# Altium footprint library TYCO THD.PcbLib: 146 footprints (part 11 of 11)
Each footprint in its own frame and in the unit in brackets; x right, y up, seen from the top. Pads: shape width x height; smd on the part's side, far side on the other; paste and mask are expansions set on the pad; w line width, h text height; cw(c..) or ccw(c..) is an arc to the next point about the centre after c.
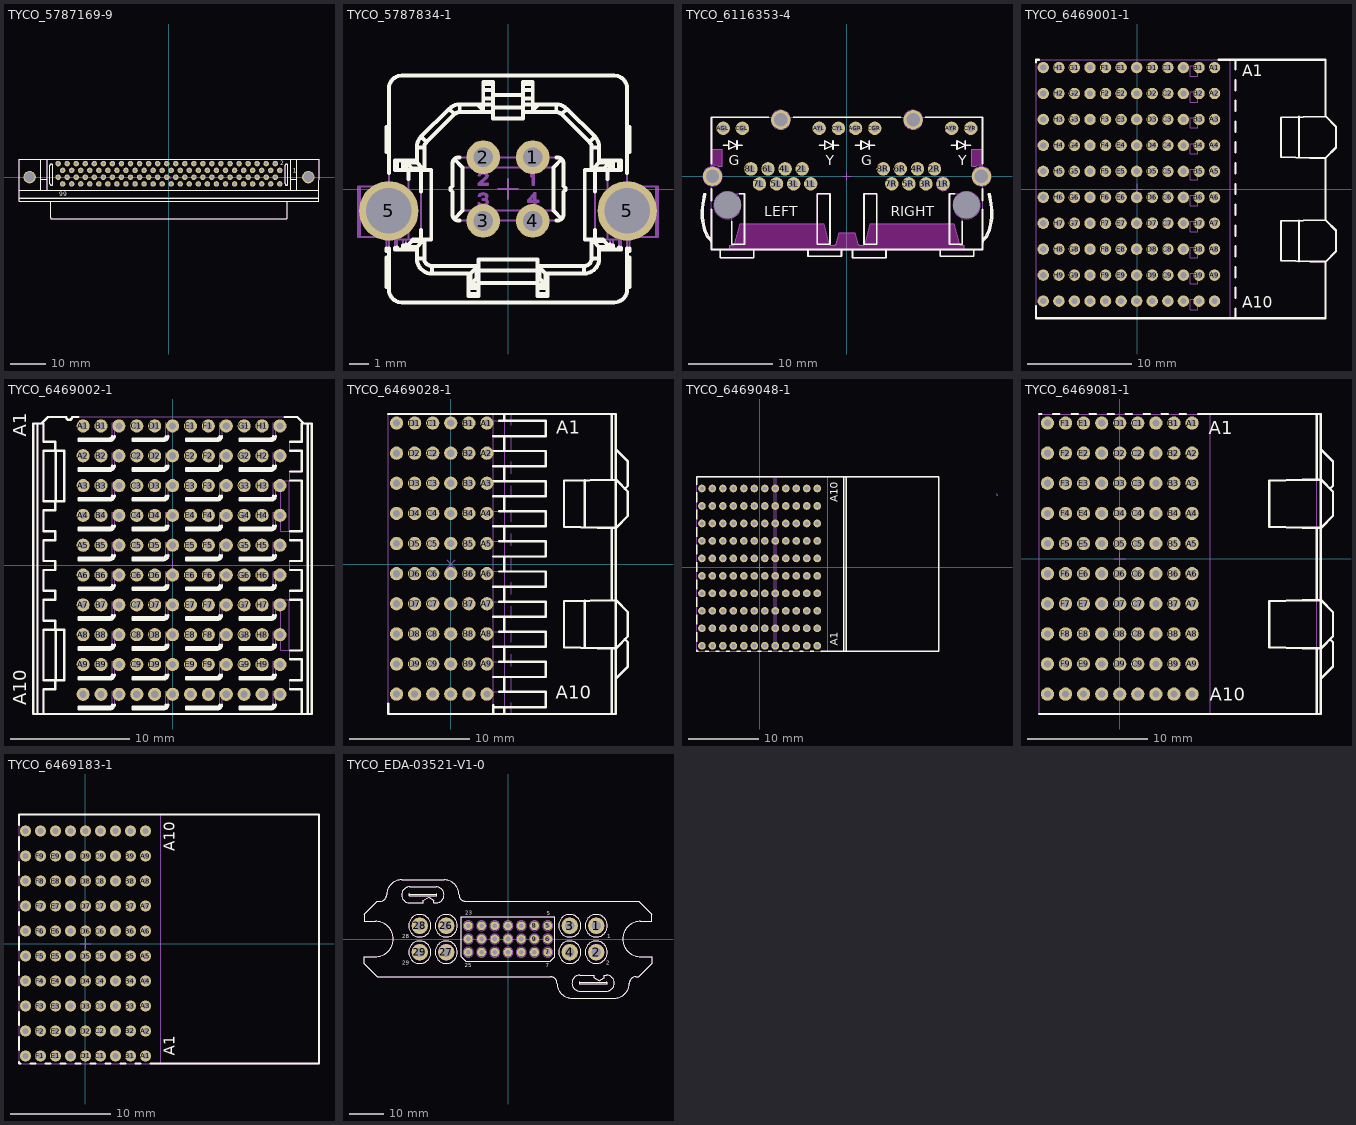
[diagram p10: the footprints below, top view; thin cyan lines are the x and y axes]

## TYCO_5787169-9 [mm] "100 Positions, .050 Right Angle D-Sub Receptacle, Series III"
height 9.5
pads (102):
  round 1.55 hole 0.85: 1(31.115,1.905) 2(29.845,3.81) 3(28.575,1.905) 4(27.305,3.81) 5(26.035,1.905) 6(24.765,3.81) 7(23.495,1.905) 8(22.225,3.81) 9(20.955,1.905) 10(19.685,3.81) 11(18.415,1.905) 12(17.145,3.81) 13(15.875,1.905) 14(14.605,3.81) 15(13.335,1.905) 16(12.065,3.81) 17(10.795,1.905) 18(9.525,3.81) 19(8.255,1.905) 20(6.985,3.81) 21(5.715,1.905) 22(4.445,3.81) 23(3.175,1.905) 24(1.905,3.81) 25(0.635,1.905) 26(-0.635,3.81) 27(-1.905,1.905) 28(-3.175,3.81) 29(-4.445,1.905) 30(-5.715,3.81) 31(-6.985,1.905) 32(-8.255,3.81) 33(-9.525,1.905) 34(-10.795,3.81) 35(-12.065,1.905) 36(-13.335,3.81) 37(-14.605,1.905) 38(-15.875,3.81) 39(-17.145,1.905) 40(-18.415,3.81) 41(-19.685,1.905) 42(-20.955,3.81) 43(-22.225,1.905) 44(-23.495,3.81) 45(-24.765,1.905) 46(-26.035,3.81) 47(-27.305,1.905) 48(-28.575,3.81) 49(-29.845,1.905) 50(-31.115,3.81) 51(31.115,-1.905) 52(29.845,0) 53(28.575,-1.905) 54(27.305,0) 55(26.035,-1.905) 56(24.765,0) 57(23.495,-1.905) 58(22.225,0) 59(20.955,-1.905) 60(19.685,0) 61(18.415,-1.905) 62(17.145,0) 63(15.875,-1.905) 64(14.605,0) 65(13.335,-1.905) 66(12.065,0) 67(10.795,-1.905) 68(9.525,0) 69(8.255,-1.905) 70(6.985,0) 71(5.715,-1.905) 72(4.445,0) 73(3.175,-1.905) 74(1.905,0) 75(0.635,-1.905) 76(-0.635,0) 77(-1.905,-1.905) 78(-3.175,0) 79(-4.445,-1.905) 80(-5.715,0) 81(-6.985,-1.905) 82(-8.255,0) 83(-9.525,-1.905) 84(-10.795,0) 85(-12.065,-1.905) 86(-13.335,0) 87(-14.605,-1.905) 88(-15.875,0) 89(-17.145,-1.905) 90(-18.415,0) 91(-19.685,-1.905) 92(-20.955,0) 93(-22.225,-1.905) 94(-23.495,0) 95(-24.765,-1.905) 96(-26.035,0) 97(-27.305,-1.905) 98(-28.575,0) 99(-29.845,-1.905) 100(-31.115,0)
  round 3.5 hole 2.8: 101(39.116,0) 102(-39.116,0)
Top Overlay:
  lines w0.1: -33.401,-1.864 ccw(c-33.02,-1.864) -32.639,-1.864 ; -33.401,3.317 cw(c-33.02,3.317) -32.639,3.317 ; -33.223,-11.394 ccw(c-32.923,-11.394) -32.923,-11.694 ; 32.639,-1.864 ccw(c33.02,-1.864) 33.401,-1.864 ; 32.639,3.317 cw(c33.02,3.317) 33.401,3.317 ; 32.923,-11.694 ccw(c32.923,-11.394) 33.223,-11.394
  lines w0.2: -42.1,-5.903 42.102,-5.932 ; -42.1,-3.693 42.101,-3.693 ; -35.941,-3.693 -35.941,5.07 ; -35.941,-0.518 -34.163,-0.518 ; -34.163,-3.693 -34.163,5.07 ; -33.401,-1.864 -33.401,3.317 ; -33.223,-11.394 -33.223,-6.69 ; -32.923,-11.694 32.923,-11.694 ; -32.639,-1.864 -32.639,3.317 ; 32.639,-1.864 32.639,3.317 ; 33.223,-11.394 33.223,-6.69 ; 33.401,-1.864 33.401,3.317 ; 34.163,-3.693 34.163,5.07 ; 34.163,-0.518 35.941,-0.518 ; 35.941,-3.693 35.941,5.07 ; 42.101,5.07 -42.1,5.07 -42.1,-6.69 42.101,-6.69 42.128,5.07
  text "99" at -30.75,-5.35 h1.2
  text "1" at 34.775,1.25 h1.2
  text "2" at 31.205,3.37 h1.2
Mechanical 8:
  drawing of 414 lines, arcs and shapes, not listed
  text "PCB Edge" at -4.325,-5.25 h1.2
Mechanical 14:
  circle w0.1: c-39.116,-0.01 r1.092
  circle w0.1: c39.116,-0.01 r1.092
  lines w0.1: -42.1,-5.903 42.102,-5.932 ; -42.1,-3.693 42.101,-3.693 ; -35.941,-3.693 -35.941,5.07 ; -35.941,-0.518 -34.163,-0.518 ; -34.163,-3.693 -34.163,5.07 ; -33.223,-6.69 -33.223,-11.394 ccw(c-32.923,-11.394) -32.923,-11.694 32.923,-11.694 ccw(c32.923,-11.394) 33.223,-11.394 33.223,-6.69 ; 34.163,-3.693 34.163,5.07 ; 34.163,-0.518 35.941,-0.518 ; 35.941,-3.693 35.941,5.07 ; 42.101,5.07 -42.1,5.07 -42.1,-6.69 42.101,-6.69 42.128,5.07 ; -33.401,-1.864 ccw(c-33.02,-1.864) -32.639,-1.864 -32.639,3.317 ccw(c-33.02,3.317) -33.401,3.317 -33.401,-1.864 ; 32.639,-1.864 ccw(c33.02,-1.864) 33.401,-1.864 33.401,3.317 ccw(c33.02,3.317) 32.639,3.317 32.639,-1.864
  text "99" at -30.75,-5.35 h1.2
  text "51" at 32.25,-2.55 h1.2
  text "52" at 31.769,-0.573 h1.2
  text "2" at 31.205,3.37 h1.2
  text "1" at 34.775,1.25 h1.2
3D body "TYCO_5787169-9.stp": height 9.5, standoff -2.54, extent -42.1,-11.694 42.101,5.07

## TYCO_5787834-1 [mm] "4 Position, Straight USB Type B Receptacle"
height 15.62
pads (6):
  round 1.7 hole 1: 1(1.25,1.605) 2(-1.25,1.605) 3(-1.25,-1.605) 4(1.25,-1.605)
  round 3 hole 2.3: 5(-6.02,-1.1) 5(6.02,-1.1)
Top Overlay:
  drawing of 188 lines, arcs and shapes, not listed
Mechanical 8:
  lines w0.1: -6.52,-1.1 -6.02,-1.1 ; -6.02,-1.6 -6.02,-1.1 ; -6.02,-0.6 -6.02,-1.1 ; -5.52,-1.1 -6.02,-1.1 ; -1.75,-1.605 -1.25,-1.605 ; -1.75,1.605 -1.25,1.605 ; -1.25,-2.105 -1.25,-1.605 ; -1.25,-1.105 -1.25,-1.605 ; -1.25,1.105 -1.25,1.605 ; -1.25,2.105 -1.25,1.605 ; -0.75,-1.605 -1.25,-1.605 ; -0.75,1.605 -1.25,1.605 ; -0.5,0 0,0 ; 0,-0.5 0,0 ; 0,0.5 0,0 ; 0.5,0 0,0 ; 0.75,-1.605 1.25,-1.605 ; 0.75,1.605 1.25,1.605 ; 1.25,-2.105 1.25,-1.605 ; 1.25,-1.105 1.25,-1.605 ; 1.25,1.105 1.25,1.605 ; 1.25,2.105 1.25,1.605 ; 1.75,-1.605 1.25,-1.605 ; 1.75,1.605 1.25,1.605 ; 5.52,-1.1 6.02,-1.1 ; 6.02,-1.6 6.02,-1.1 ; 6.02,-0.6 6.02,-1.1 ; 6.52,-1.1 6.02,-1.1
Mechanical 14:
  drawing of 314 lines, arcs and shapes, not listed
3D body "TYCO_5787834-1.stp": height 15.62, standoff -4.02, extent -7.571,-5.723 7.572,5.733

## TYCO_6116353-4 [mm] "2 Port, Yellow/Green LEDs, Right Angle RJ45 10/100 Base-T Ethernet Jack Module (Inverted Face)"
height 13.97
pads (30):
  round 1.6 hole 0.9: 1L(-4.318,-0.889) 1R(11.43,-0.889) 2L(-5.334,0.889) 2R(10.414,0.889) 3L(-6.35,-0.889) 3R(9.398,-0.889) 4L(-7.366,0.889) 4R(8.382,0.889) 5L(-8.382,-0.889) 5R(7.366,-0.889) 6L(-9.398,0.889) 6R(6.35,0.889) 7L(-10.414,-0.889) 7R(5.334,-0.889) 8L(-11.43,0.889) 8R(4.318,0.889) AGL(-14.732,5.715) AGR(1.016,5.715) AYL(-3.302,5.715) AYR(12.446,5.715) CGL(-12.446,5.715) CGR(3.302,5.715) CYL(-1.016,5.715) CYR(14.732,5.715)
  round 0.5 hole 3.2 unplated mask+1.35: M1(14.224,-3.429) M2(-14.224,-3.429)
  round 2.3 hole 1.6: SHIELD(-16.002,0) SHIELD(-7.874,6.731) SHIELD(7.874,6.731) SHIELD(16.002,0)
Top Layer keep-out:
  region: -13.97,-8.204 -13.589,-8.204 -13.548,-8.201 -13.469,-8.174 -13.404,-8.124 -13.358,-8.055 -13.344,-8.016 -12.714,-5.664 -2.794,-5.664 -2.164,-8.016 -2.15,-8.055 -2.104,-8.124 -2.038,-8.174 -1.96,-8.201 -1.919,-8.204 -1.524,-8.204 -1.483,-8.201 -1.404,-8.174 -1.339,-8.124 -1.293,-8.055 -1.279,-8.016 -0.921,-6.68 0.921,-6.68 1.279,-8.016 1.293,-8.055 1.339,-8.124 1.404,-8.174 1.483,-8.201 1.524,-8.204 1.919,-8.204 1.96,-8.201 2.038,-8.174 2.104,-8.124 2.15,-8.055 2.164,-8.016 2.794,-5.664 12.714,-5.664 13.344,-8.016 13.358,-8.055 13.404,-8.124 13.469,-8.174 13.548,-8.201 13.589,-8.204 13.97,-8.204 13.97,-8.712 -13.97,-8.712
  region: -16.129,1.344 -16.031,1.35 -15.836,1.34 -15.644,1.302 -15.46,1.236 -15.372,1.194 -14.859,1.194 -14.859,3.226 -16.129,3.226
  region: 14.859,1.194 15.372,1.194 15.46,1.236 15.644,1.302 15.836,1.34 16.031,1.35 16.129,1.344 16.129,3.226 14.859,3.226
Top Overlay:
  lines w0.2: -16.129,-8.077 ccw(c-16.891,-8.077) -16.401,-7.493 cw(c-15.459,-6.371) -16.81,-6.939 cw(c-10.845,-4.407) -17.23,-3.299 -17.018,-2.057 -16.824,-2.09 -17.036,-3.332 ccw(c-10.817,-4.404) -16.653,-6.805 ccw(c-15.459,-6.371) -16.275,-7.344 cw(c-16.891,-8.077) -16.129,-7.497 ; -16.129,-3.95 -16.129,-8.712 16.129,-8.712 16.129,-3.95 ; -16.129,-2.908 -16.129,-1.495 ; -16.129,1.495 -16.129,7.036 -9.343,7.036 ; -15.088,-8.712 -15.088,-9.685 -11.1,-9.685 -11.1,-8.712 ; -14.732,3.715 -14.089,3.715 ; -13.716,-5.338 -13.716,-8.077 -12.192,-8.077 -12.192,-2.057 -12.803,-2.057 ; -13.089,3.215 -13.089,4.215 ; -12.446,3.715 -13.089,3.715 ; -6.405,7.036 6.405,7.036 ; -4.648,-8.712 -4.648,-9.522 -0.66,-9.522 -0.66,-8.712 ; -3.302,3.715 -2.659,3.715 ; -1.659,3.215 -1.659,4.215 ; -1.016,3.715 -1.659,3.715 ; 0.66,-8.712 0.66,-9.685 4.648,-9.685 4.648,-8.712 ; 1.016,3.715 1.659,3.715 ; 2.659,3.215 2.659,4.215 ; 3.302,3.715 2.659,3.715 ; 9.343,7.036 16.129,7.036 16.129,1.495 ; 11.1,-8.712 11.1,-9.522 15.088,-9.522 15.088,-8.712 ; 12.446,3.715 13.089,3.715 ; 12.803,-2.057 12.192,-2.057 12.192,-8.077 13.716,-8.077 13.716,-5.338 ; 14.089,3.215 14.089,4.215 ; 14.732,3.715 14.089,3.715 ; 16.129,-2.908 16.129,-1.495 ; 16.13,-8.077 cw(c16.892,-8.077) 16.402,-7.493 ccw(c15.46,-6.371) 16.811,-6.939 ccw(c10.846,-4.407) 17.231,-3.299 17.019,-2.057 16.825,-2.09 17.037,-3.332 cw(c10.818,-4.403) 16.654,-6.805 cw(c15.46,-6.371) 16.277,-7.343 ccw(c16.892,-8.077) 16.13,-7.497 ; -13.089,3.715 -14.089,4.215 -14.089,3.215 -13.089,3.715 ; -1.659,3.715 -2.659,4.215 -2.659,3.215 -1.659,3.715 ; 2.659,3.715 1.659,4.215 1.659,3.215 2.659,3.715 ; 14.089,3.715 13.089,4.215 13.089,3.215 14.089,3.715 ; -3.556,-8.077 -2.032,-8.077 -2.032,-2.057 -3.556,-2.057 -3.556,-8.077 ; 2.032,-8.077 3.556,-8.077 3.556,-2.057 2.032,-2.057 2.032,-8.077
  text "RIGHT" at 5.218,-4.75 h1.2
  text "LEFT" at -9.83,-4.75 h1.2
  text "Y" at 13.218,1.35 h1.2
  text "Y" at -2.53,1.35 h1.2
  text "G" at 1.697,1.35 h1.2
  text "G" at -14.051,1.35 h1.2
Mechanical 8:
  drawing of 191 lines, arcs and shapes, not listed
  text "1" at 11.82,-2.115 h1.2
  text "8" at 4.828,3.365 h1.2
Mechanical 14:
  lines w0.1: -16.129,-8.077 ccw(c-16.891,-8.077) -16.401,-7.493 cw(c-15.459,-6.371) -16.81,-6.939 cw(c-10.845,-4.407) -17.23,-3.299 -17.018,-2.057 -16.824,-2.09 -17.036,-3.332 ccw(c-10.817,-4.404) -16.653,-6.805 ccw(c-15.459,-6.371) -16.275,-7.344 cw(c-16.891,-8.077) -16.129,-7.497 ; -15.088,-8.712 -15.088,-9.685 -11.1,-9.685 -11.1,-8.712 ; -14.732,3.715 -14.089,3.715 ; -13.089,3.215 -13.089,4.215 ; -12.446,3.715 -13.089,3.715 ; -4.648,-8.712 -4.648,-9.522 -0.66,-9.522 -0.66,-8.712 ; -3.302,3.715 -2.659,3.715 ; -1.659,3.215 -1.659,4.215 ; -1.016,3.715 -1.659,3.715 ; 0.66,-8.712 0.66,-9.685 4.648,-9.685 4.648,-8.712 ; 1.016,3.715 1.659,3.715 ; 2.659,3.215 2.659,4.215 ; 3.302,3.715 2.659,3.715 ; 11.1,-8.712 11.1,-9.522 15.088,-9.522 15.088,-8.712 ; 12.446,3.715 13.089,3.715 ; 14.089,3.215 14.089,4.215 ; 14.732,3.715 14.089,3.715 ; 16.13,-8.077 cw(c16.892,-8.077) 16.402,-7.493 ccw(c15.46,-6.371) 16.811,-6.939 ccw(c10.846,-4.407) 17.231,-3.299 17.019,-2.057 16.825,-2.09 17.037,-3.332 cw(c10.818,-4.403) 16.654,-6.805 cw(c15.46,-6.371) 16.277,-7.343 ccw(c16.892,-8.077) 16.13,-7.497 ; -13.089,3.715 -14.089,4.215 -14.089,3.215 -13.089,3.715 ; -1.659,3.715 -2.659,4.215 -2.659,3.215 -1.659,3.715 ; 2.659,3.715 1.659,4.215 1.659,3.215 2.659,3.715 ; 14.089,3.715 13.089,4.215 13.089,3.215 14.089,3.715 ; -16.129,-8.712 -16.129,7.036 16.129,7.036 16.129,-8.712 -16.129,-8.712 ; -13.716,-8.077 -12.192,-8.077 -12.192,-2.057 -13.716,-2.057 -13.716,-8.077 ; -3.556,-8.077 -2.032,-8.077 -2.032,-2.057 -3.556,-2.057 -3.556,-8.077 ; 2.032,-8.077 3.556,-8.077 3.556,-2.057 2.032,-2.057 2.032,-8.077 ; 12.192,-8.077 13.716,-8.077 13.716,-2.057 12.192,-2.057 12.192,-8.077
  text "RIGHT" at 5.218,-4.75 h1.2
  text "LEFT" at -9.83,-4.75 h1.2
  text "Y" at 13.218,1.35 h1.2
  text "Y" at -2.53,1.35 h1.2
  text "G" at 1.697,1.35 h1.2
  text "G" at -14.051,1.35 h1.2
3D body "TYCO_6116353-4.stp": height 14.56, standoff -4.17, extent -17.324,-9.685 17.325,7.036

## TYCO_6469001-1 [mm] "80 Positions, Pitch 2.5mm,  Advanced TCA, Z-PACK HM-Zd Right Angle Press Fit Receptacle"
height 15.72
pads (120):
  round 1.1 hole 0.6: A1(7.435,11.7) A2(7.435,9.2) A3(7.435,6.7) A4(7.435,4.2) A5(7.435,1.7) A6(7.435,-0.8) A7(7.435,-3.3) A8(7.435,-5.8) A9(7.435,-8.3) A10(7.435,-10.8) B1(5.935,11.7) B2(5.935,9.2) B3(5.935,6.7) B4(5.935,4.2) B5(5.935,1.7) B6(5.935,-0.8) B7(5.935,-3.3) B8(5.935,-5.8) B9(5.935,-8.3) B10(5.935,-10.8) BG1(4.435,11.7) BG2(4.435,9.2) BG3(4.435,6.7) BG4(4.435,4.2) BG5(4.435,1.7) BG6(4.435,-0.8) BG7(4.435,-3.3) BG8(4.435,-5.8) BG9(4.435,-8.3) BG10(4.435,-10.8) C1(2.935,11.7) C2(2.935,9.2) C3(2.935,6.7) C4(2.935,4.2) C5(2.935,1.7) C6(2.935,-0.8) C7(2.935,-3.3) C8(2.935,-5.8) C9(2.935,-8.3) C10(2.935,-10.8) D1(1.435,11.7) D2(1.435,9.2) D3(1.435,6.7) D4(1.435,4.2) D5(1.435,1.7) D6(1.435,-0.8) D7(1.435,-3.3) D8(1.435,-5.8) D9(1.435,-8.3) D10(1.435,-10.8) DG1(-0.065,11.7) DG2(-0.065,9.2) DG3(-0.065,6.7) DG4(-0.065,4.2) DG5(-0.065,1.7) DG6(-0.065,-0.8) DG7(-0.065,-3.3) DG8(-0.065,-5.8) DG9(-0.065,-8.3) DG10(-0.065,-10.8) E1(-1.565,11.7) E2(-1.565,9.2) E3(-1.565,6.7) E4(-1.565,4.2) E5(-1.565,1.7) E6(-1.565,-0.8) E7(-1.565,-3.3) E8(-1.565,-5.8) E9(-1.565,-8.3) E10(-1.565,-10.8) F1(-3.065,11.7) F2(-3.065,9.2) F3(-3.065,6.7) F4(-3.065,4.2) F5(-3.065,1.7) F6(-3.065,-0.8) F7(-3.065,-3.3) F8(-3.065,-5.8) F9(-3.065,-8.3) F10(-3.065,-10.8) FG1(-4.565,11.7) FG2(-4.565,9.2) FG3(-4.565,6.7) FG4(-4.565,4.2) FG5(-4.565,1.7) FG6(-4.565,-0.8) FG7(-4.565,-3.3) FG8(-4.565,-5.8) FG9(-4.565,-8.3) FG10(-4.565,-10.8) G1(-6.065,11.7) G2(-6.065,9.2) G3(-6.065,6.7) G4(-6.065,4.2) G5(-6.065,1.7) G6(-6.065,-0.8) G7(-6.065,-3.3) G8(-6.065,-5.8) G9(-6.065,-8.3) G10(-6.065,-10.8) H1(-7.565,11.7) H2(-7.565,9.2) H3(-7.565,6.7) H4(-7.565,4.2) H5(-7.565,1.7) H6(-7.565,-0.8) H7(-7.565,-3.3) H8(-7.565,-5.8) H9(-7.565,-8.3) H10(-7.565,-10.8) HG1(-9.065,11.7) HG2(-9.065,9.2) HG3(-9.065,6.7) HG4(-9.065,4.2) HG5(-9.065,1.7) HG6(-9.065,-0.8) HG7(-9.065,-3.3) HG8(-9.065,-5.8) HG9(-9.065,-8.3) HG10(-9.065,-10.8)
Top Overlay:
  lines w0.2: -9.765,-11.282 -9.765,-12.45 18.135,-12.45 18.135,-7 ; -9.765,12.182 -9.765,12.45 -9.465,12.45 ; 7.835,12.45 18.135,12.45 18.135,7 ; 9.435,-12.45 9.435,-11.5 ; 9.435,-10.5 9.435,-9.5 ; 9.435,-8.5 9.435,-7.5 ; 9.435,-6.5 9.435,-5.5 ; 9.435,-4.5 9.435,-3.5 ; 9.435,-2.5 9.435,-1.5 ; 9.435,-0.5 9.435,0.5 ; 9.435,1.5 9.435,2.5 ; 9.435,3.5 9.435,4.5 ; 9.435,5.5 9.435,6.5 ; 9.435,7.5 9.435,8.5 ; 9.435,9.5 9.435,10.5 ; 9.435,11.5 9.435,12.45 ; 15.565,-6.963 15.565,-3.037 ; 15.565,3.037 15.565,6.963 ; 18.135,-7 16.635,-7 13.835,-6.903 13.835,-3.097 18.135,-3 ; 18.135,-7 19.135,-6 19.135,-4 18.135,-3 ; 18.135,-3 18.135,3 ; 18.135,3 16.635,3 13.835,3.097 13.835,6.903 18.135,7 ; 18.135,3 19.135,4 19.135,6 18.135,7
  text "A10" at 10.1,-11.425 h1.1
  text "A1" at 10.1,10.85 h1.1
Mechanical 8:
  drawing of 486 lines, arcs and shapes, not listed
  text "PCB Edge" at 10.3,-3.5 h1
Mechanical 14:
  lines w0.1: 9.435,-12.45 9.435,-11.5 ; 9.435,-10.5 9.435,-9.5 ; 9.435,-8.5 9.435,-7.5 ; 9.435,-6.5 9.435,-5.5 ; 9.435,-4.5 9.435,-3.5 ; 9.435,-2.5 9.435,-1.5 ; 9.435,-0.5 9.435,0.5 ; 9.435,1.5 9.435,2.5 ; 9.435,3.5 9.435,4.5 ; 9.435,5.5 9.435,6.5 ; 9.435,7.5 9.435,8.5 ; 9.435,9.5 9.435,10.5 ; 9.435,11.5 9.435,12.45 ; 15.565,-6.963 15.565,-3.037 ; 15.565,3.037 15.565,6.963 ; 18.135,-7 16.635,-7 13.835,-6.903 13.835,-3.097 18.135,-3 ; 18.135,-7 19.135,-6 19.135,-4 18.135,-3 ; 18.135,-7 18.135,-12.45 -9.765,-12.45 -9.765,12.45 18.135,12.45 18.135,7 ; 18.135,-3 18.135,3 ; 18.135,3 16.635,3 13.835,3.097 13.835,6.903 18.135,7 ; 18.135,3 19.135,4 19.135,6 18.135,7 ; 5.115,-11.62 5.115,-10.62 5.835,-10.62 5.835,-11.62 5.115,-11.62 ; 5.115,-9.12 5.115,-8.12 5.835,-8.12 5.835,-9.12 5.115,-9.12 ; 5.115,-6.62 5.115,-5.62 5.835,-5.62 5.835,-6.62 5.115,-6.62 ; 5.115,-4.12 5.115,-3.12 5.835,-3.12 5.835,-4.12 5.115,-4.12 ; 5.115,-1.62 5.115,-0.62 5.835,-0.62 5.835,-1.62 5.115,-1.62 ; 5.115,0.88 5.115,1.88 5.835,1.88 5.835,0.88 5.115,0.88 ; 5.115,3.38 5.115,4.38 5.835,4.38 5.835,3.38 5.115,3.38 ; 5.115,5.88 5.115,6.88 5.835,6.88 5.835,5.88 5.115,5.88 ; 5.115,8.38 5.115,9.38 5.835,9.38 5.835,8.38 5.115,8.38 ; 5.115,10.88 5.115,11.88 5.835,11.88 5.835,10.88 5.115,10.88
  text "A10" at 10.1,-11.425 h1.1
  text "A1" at 10.1,10.85 h1.1
Drill Drawing:
  lines w0.1: -9.75,-11.55 8.25,-11.55 8.25,12.45 -9.75,12.45 -9.75,-11.55
  text "diam. 0.6mm +0.06 -0" at 11.2,-9.3 h1
  text "PRESS-FIT TECHNOLOGY" at 9.7,-8.3 h1
3D body "TYCO_6469001-1.stp": height 16.67, standoff -4.68, extent -9.765,-12.45 19.135,12.45

## TYCO_6469002-1 [mm] "80 Positions, Pitch 2.5mm,  Advanced TCA, Z-PACK HM-Zd BackPlane Press Fit Header"
height 13.48
pads (120):
  round 1.1 hole 0.6: A1(-7.5,11.7) A2(-7.5,9.2) A3(-7.5,6.7) A4(-7.5,4.2) A5(-7.5,1.7) A6(-7.5,-0.8) A7(-7.5,-3.3) A8(-7.5,-5.8) A9(-7.5,-8.3) A10(-7.5,-10.8) B1(-6,11.7) B2(-6,9.2) B3(-6,6.7) B4(-6,4.2) B5(-6,1.7) B6(-6,-0.8) B7(-6,-3.3) B8(-6,-5.8) B9(-6,-8.3) B10(-6,-10.8) BG1(-4.5,11.7) BG2(-4.5,9.2) BG3(-4.5,6.7) BG4(-4.5,4.2) BG5(-4.5,1.7) BG6(-4.5,-0.8) BG7(-4.5,-3.3) BG8(-4.5,-5.8) BG9(-4.5,-8.3) BG10(-4.5,-10.8) C1(-3,11.7) C2(-3,9.2) C3(-3,6.7) C4(-3,4.2) C5(-3,1.7) C6(-3,-0.8) C7(-3,-3.3) C8(-3,-5.8) C9(-3,-8.3) C10(-3,-10.8) D1(-1.5,11.7) D2(-1.5,9.2) D3(-1.5,6.7) D4(-1.5,4.2) D5(-1.5,1.7) D6(-1.5,-0.8) D7(-1.5,-3.3) D8(-1.5,-5.8) D9(-1.5,-8.3) D10(-1.5,-10.8) DG1(0,11.7) DG2(0,9.2) DG3(0,6.7) DG4(0,4.2) DG5(0,1.7) DG6(0,-0.8) DG7(0,-3.3) DG8(0,-5.8) DG9(0,-8.3) DG10(0,-10.8) E1(1.5,11.7) E2(1.5,9.2) E3(1.5,6.7) E4(1.5,4.2) E5(1.5,1.7) E6(1.5,-0.8) E7(1.5,-3.3) E8(1.5,-5.8) E9(1.5,-8.3) E10(1.5,-10.8) F1(3,11.7) F2(3,9.2) F3(3,6.7) F4(3,4.2) F5(3,1.7) F6(3,-0.8) F7(3,-3.3) F8(3,-5.8) F9(3,-8.3) F10(3,-10.8) FG1(4.5,11.7) FG2(4.5,9.2) FG3(4.5,6.7) FG4(4.5,4.2) FG5(4.5,1.7) FG6(4.5,-0.8) FG7(4.5,-3.3) FG8(4.5,-5.8) FG9(4.5,-8.3) FG10(4.5,-10.8) G1(6,11.7) G2(6,9.2) G3(6,6.7) G4(6,4.2) G5(6,1.7) G6(6,-0.8) G7(6,-3.3) G8(6,-5.8) G9(6,-8.3) G10(6,-10.8) H1(7.5,11.7) H2(7.5,9.2) H3(7.5,6.7) H4(7.5,4.2) H5(7.5,1.7) H6(7.5,-0.8) H7(7.5,-3.3) H8(7.5,-5.8) H9(7.5,-8.3) H10(7.5,-10.8) HG1(9,11.7) HG2(9,9.2) HG3(9,6.7) HG4(9,4.2) HG5(9,1.7) HG6(9,-0.8) HG7(9,-3.3) HG8(9,-5.8) HG9(9,-8.3) HG10(9,-10.8)
Top Overlay:
  drawing of 268 lines, arcs and shapes, not listed
  text "A10" at -12.275,-11.725 h1.1
  text "A1" at -12.275,10.775 h1.1
Mechanical 8:
  drawing of 484 lines, arcs and shapes, not listed
Mechanical 14:
  drawing of 717 lines, arcs and shapes, not listed
  text "A10" at -12.275,-11.725 h1.1
  text "A1" at -12.275,10.775 h1.1
Drill Drawing:
  lines w0.1: -8.25,-11.55 9.75,-11.55 9.75,12.45 -8.25,12.45 -8.25,-11.55
  text "diam. 0.6mm +0.06 -0" at 11.1,-9.2 h1
  text "PRESS-FIT TECHNOLOGY" at -8.8,-8.1 h1
3D body "TYCO_6469002-1.stp": height 13.4, standoff -2.5, extent -11.675,-12.45 11.675,12.45

## TYCO_6469028-1 [mm] "40 Positions, Pitch 2.5mm,  Advanced TCA, Z-PACK HM-Zd Right Angle Press Fit Receptacle"
height 8.58
pads (60):
  round 1.1 hole 0.6: A1(3,11.7) A2(3,9.2) A3(3,6.7) A4(3,4.2) A5(3,1.7) A6(3,-0.8) A7(3,-3.3) A8(3,-5.8) A9(3,-8.3) A10(3,-10.8) B1(1.5,11.7) B2(1.5,9.2) B3(1.5,6.7) B4(1.5,4.2) B5(1.5,1.7) B6(1.5,-0.8) B7(1.5,-3.3) B8(1.5,-5.8) B9(1.5,-8.3) B10(1.5,-10.8) BG1(0,11.7) BG2(0,9.2) BG3(0,6.7) BG4(0,4.2) BG5(0,1.7) BG6(0,-0.8) BG7(0,-3.3) BG8(0,-5.8) BG9(0,-8.3) BG10(0,-10.8) C1(-1.5,11.7) C2(-1.5,9.2) C3(-1.5,6.7) C4(-1.5,4.2) C5(-1.5,1.7) C6(-1.5,-0.8) C7(-1.5,-3.3) C8(-1.5,-5.8) C9(-1.5,-8.3) C10(-1.5,-10.8) D1(-3,11.7) D2(-3,9.2) D3(-3,6.7) D4(-3,4.2) D5(-3,1.7) D6(-3,-0.8) D7(-3,-3.3) D8(-3,-5.8) D9(-3,-8.3) D10(-3,-10.8) DG1(-4.5,11.7) DG2(-4.5,9.2) DG3(-4.5,6.7) DG4(-4.5,4.2) DG5(-4.5,1.7) DG6(-4.5,-0.8) DG7(-4.5,-3.3) DG8(-4.5,-5.8) DG9(-4.5,-8.3) DG10(-4.5,-10.8)
Top Overlay:
  lines w0.2: -5.2,-11.583 -5.2,-12.45 13.7,-12.45 13.7,12.45 -5.2,12.45 ; 3.54,-12.45 3.54,-11.701 ; 3.54,-11.88 7.9,-11.88 7.9,-10.62 4.034,-10.62 ; 3.54,-9.38 7.9,-9.38 7.9,-8.12 4.034,-8.12 ; 3.54,-6.88 7.9,-6.88 7.9,-5.62 4.034,-5.62 ; 3.54,-4.38 7.9,-4.38 7.9,-3.12 4.034,-3.12 ; 3.54,-1.88 7.9,-1.88 7.9,-0.62 4.034,-0.62 ; 3.54,0.62 7.9,0.62 7.9,1.88 4.034,1.88 ; 3.54,3.12 7.9,3.12 7.9,4.38 4.034,4.38 ; 3.54,5.62 7.9,5.62 7.9,6.88 3.54,6.88 ; 3.54,8.12 7.9,8.12 7.9,9.38 3.54,9.38 ; 3.54,10.62 7.9,10.62 7.9,11.88 4.034,11.88 ; 4.45,-12.45 4.45,-11.88 ; 4.45,-10.62 4.45,-9.38 ; 4.45,-8.12 4.45,-6.88 ; 4.45,-5.62 4.45,-4.38 ; 4.45,-3.12 4.45,-1.88 ; 4.45,-0.62 4.45,0.62 ; 4.45,1.88 4.45,3.12 ; 4.45,4.38 4.45,5.62 ; 4.45,6.88 4.45,8.12 ; 4.45,9.38 4.45,10.62 ; 4.45,11.88 4.45,12.45 ; 11.13,-6.963 11.13,-3.037 ; 11.13,3.037 11.13,6.963 ; 13.35,-12.45 13.35,-7 ; 13.35,-3 13.35,3 ; 13.35,7 13.35,12.45 ; 13.7,-9.5 14.7,-8.5 14.7,-6.5 14.45,-6.25 ; 13.7,9.5 14.7,8.5 14.7,6.5 14.45,6.25 ; 9.4,-6.903 12.2,-7 13.7,-7 14.7,-6 14.7,-4 13.7,-3 9.4,-3.097 9.4,-6.903 ; 9.4,3.097 12.2,3 13.7,3 14.7,4 14.7,6 13.7,7 9.4,6.903 9.4,3.097
  text "A10" at 8.7,-11.2 h1.1
  text "A1" at 8.75,10.8 h1.1
Mechanical 8:
  drawing of 246 lines, arcs and shapes, not listed
  text "PCB Edge" at 5.865,-3.5 h1
Mechanical 14:
  lines w0.1: 3.54,-12.45 3.54,12.45 ; 3.54,-11.88 7.9,-11.88 7.9,-10.62 3.54,-10.62 ; 3.54,-9.38 7.9,-9.38 7.9,-8.12 3.54,-8.12 ; 3.54,-6.88 7.9,-6.88 7.9,-5.62 3.54,-5.62 ; 3.54,-4.38 7.9,-4.38 7.9,-3.12 3.54,-3.12 ; 3.54,-1.88 7.9,-1.88 7.9,-0.62 3.54,-0.62 ; 3.54,0.62 7.9,0.62 7.9,1.88 3.54,1.88 ; 3.54,3.12 7.9,3.12 7.9,4.38 3.54,4.38 ; 3.54,5.62 7.9,5.62 7.9,6.88 3.54,6.88 ; 3.54,8.12 7.9,8.12 7.9,9.38 3.54,9.38 ; 3.54,10.62 7.9,10.62 7.9,11.88 3.54,11.88 ; 4.45,-12.45 4.45,-11.88 ; 4.45,-10.62 4.45,-9.38 ; 4.45,-8.12 4.45,-6.88 ; 4.45,-5.62 4.45,-4.38 ; 4.45,-3.12 4.45,-1.88 ; 4.45,-0.62 4.45,0.62 ; 4.45,1.88 4.45,3.12 ; 4.45,4.38 4.45,5.62 ; 4.45,6.88 4.45,8.12 ; 4.45,9.38 4.45,10.62 ; 4.45,11.88 4.45,12.45 ; 5,-12.45 5,-11.5 ; 5,-10.5 5,-9.5 ; 5,-8.5 5,-7.5 ; 5,-6.5 5,-5.5 ; 5,-4.5 5,-3.5 ; 5,-2.5 5,-1.5 ; 5,-0.5 5,0.5 ; 5,1.5 5,2.5 ; 5,3.5 5,4.5 ; 5,5.5 5,6.5 ; 5,7.5 5,8.5 ; 5,9.5 5,10.5 ; 5,11.5 5,12.45 ; 11.13,-6.963 11.13,-3.037 ; 11.13,3.037 11.13,6.963 ; 13.35,-12.45 13.35,-7 ; 13.35,-3 13.35,3 ; 13.35,7 13.35,12.45 ; 13.7,-9.5 14.7,-8.5 14.7,-6.5 14.45,-6.25 ; 13.7,9.5 14.7,8.5 14.7,6.5 14.45,6.25 ; -5.2,-12.45 -5.2,12.45 13.7,12.45 13.7,-12.45 -5.2,-12.45 ; 9.4,-6.903 12.2,-7 13.7,-7 14.7,-6 14.7,-4 13.7,-3 9.4,-3.097 9.4,-6.903 ; 9.4,3.097 12.2,3 13.7,3 14.7,4 14.7,6 13.7,7 9.4,6.903 9.4,3.097
  text "A10" at 8.7,-11.2 h1.1
  text "A1" at 8.75,10.8 h1.1
Drill Drawing:
  lines w0.1: -5.2,-12.45 3.775,-12.45 3.775,12.45 -5.2,12.45 -5.2,-12.45
  text "diam. 0.6mm +0.06 -0" at 6.765,-9.3 h1
  text "PRESS-FIT TECHNOLOGY" at 5.265,-8.3 h1
3D body "TYCO_6469028-1.stp": height 8.67, standoff -4.68, extent -5.2,-12.45 14.7,12.45

## TYCO_6469048-1 [mm] "80 Positions, Pitch 2.5mm,  Advanced TCA, Z-PACK HM-Zd BackPlane Press Fit Header"
height 17.68
pads (120):
  round 1.1 hole 0.6: A1(8.25,-11.25) A2(8.25,-8.75) A3(8.25,-6.25) A4(8.25,-3.75) A5(8.25,-1.25) A6(8.25,1.25) A7(8.25,3.75) A8(8.25,6.25) A9(8.25,8.75) A10(8.25,11.25) B1(6.75,-11.25) B2(6.75,-8.75) B3(6.75,-6.25) B4(6.75,-3.75) B5(6.75,-1.25) B6(6.75,1.25) B7(6.75,3.75) B8(6.75,6.25) B9(6.75,8.75) B10(6.75,11.25) BG1(5.25,-11.25) BG2(5.25,-8.75) BG3(5.25,-6.25) BG4(5.25,-3.75) BG5(5.25,-1.25) BG6(5.25,1.25) BG7(5.25,3.75) BG8(5.25,6.25) BG9(5.25,8.75) BG10(5.25,11.25) C1(3.75,-11.25) C2(3.75,-8.75) C3(3.75,-6.25) C4(3.75,-3.75) C5(3.75,-1.25) C6(3.75,1.25) C7(3.75,3.75) C8(3.75,6.25) C9(3.75,8.75) C10(3.75,11.25) D1(2.25,-11.25) D2(2.25,-8.75) D3(2.25,-6.25) D4(2.25,-3.75) D5(2.25,-1.25) D6(2.25,1.25) D7(2.25,3.75) D8(2.25,6.25) D9(2.25,8.75) D10(2.25,11.25) DG1(0.75,-11.25) DG2(0.75,-8.75) DG3(0.75,-6.25) DG4(0.75,-3.75) DG5(0.75,-1.25) DG6(0.75,1.25) DG7(0.75,3.75) DG8(0.75,6.25) DG9(0.75,8.75) DG10(0.75,11.25) E1(-0.75,-11.25) E2(-0.75,-8.75) E3(-0.75,-6.25) E4(-0.75,-3.75) E5(-0.75,-1.25) E6(-0.75,1.25) E7(-0.75,3.75) E8(-0.75,6.25) E9(-0.75,8.75) E10(-0.75,11.25) F1(-2.25,-11.25) F2(-2.25,-8.75) F3(-2.25,-6.25) F4(-2.25,-3.75) F5(-2.25,-1.25) F6(-2.25,1.25) F7(-2.25,3.75) F8(-2.25,6.25) F9(-2.25,8.75) F10(-2.25,11.25) FG1(-3.75,-11.25) FG2(-3.75,-8.75) FG3(-3.75,-6.25) FG4(-3.75,-3.75) FG5(-3.75,-1.25) FG6(-3.75,1.25) FG7(-3.75,3.75) FG8(-3.75,6.25) FG9(-3.75,8.75) FG10(-3.75,11.25) G1(-5.25,-11.25) G2(-5.25,-8.75) G3(-5.25,-6.25) G4(-5.25,-3.75) G5(-5.25,-1.25) G6(-5.25,1.25) G7(-5.25,3.75) G8(-5.25,6.25) G9(-5.25,8.75) G10(-5.25,11.25) H1(-6.75,-11.25) H2(-6.75,-8.75) H3(-6.75,-6.25) H4(-6.75,-3.75) H5(-6.75,-1.25) H6(-6.75,1.25) H7(-6.75,3.75) H8(-6.75,6.25) H9(-6.75,8.75) H10(-6.75,11.25) HG1(-8.25,-11.25) HG2(-8.25,-8.75) HG3(-8.25,-6.25) HG4(-8.25,-3.75) HG5(-8.25,-1.25) HG6(-8.25,1.25) HG7(-8.25,3.75) HG8(-8.25,6.25) HG9(-8.25,8.75) HG10(-8.25,11.25)
Top Overlay:
  lines w0.2: -8.95,-11.816 -8.95,-12 -8.747,-12 ; -8.95,-10.684 -8.95,-9.316 ; -8.95,-8.184 -8.95,-6.816 ; -8.95,-5.684 -8.95,-4.316 ; -8.95,-3.184 -8.95,-1.816 ; -8.95,-0.684 -8.95,0.684 ; -8.95,1.816 -8.95,3.184 ; -8.95,4.316 -8.95,5.684 ; -8.95,6.816 -8.95,8.184 ; -8.95,9.316 -8.95,10.684 ; -8.95,11.816 -8.95,12.9 25.6,12.9 25.6,-12 8.748,-12 ; -7.752,-12 -7.247,-12 ; -6.252,-12 -5.747,-12 ; -4.752,-12 -4.247,-12 ; -3.252,-12 -2.747,-12 ; -1.752,-12 -1.247,-12 ; -0.252,-12 0.253,-12 ; 1.248,-12 1.753,-12 ; 2.748,-12 3.253,-12 ; 4.248,-12 4.753,-12 ; 5.748,-12 6.253,-12 ; 7.248,-12 7.753,-12 ; 12.025,-12 12.025,12.9 ; 12.38,-12 12.38,12.9
  text "A10" at 11.2,9.25 h1.1
  text "A1" at 11.2,-11.25 h1.1
Mechanical 8:
  drawing of 487 lines, arcs and shapes, not listed
  text "PCB Edge" at 11.115,-3.05 h1
Mechanical 14:
  lines w0.1: 2.08,-12 2.08,12.9 ; 2.38,-12 2.38,12.9 ; 12.025,-12 12.025,12.9 ; 12.38,-12 12.38,12.9 ; -8.95,-12 25.6,-12 25.6,12.9 -8.95,12.9 -8.95,-12
  text "A10" at 11.2,9.25 h1.1
  text "A1" at 11.2,-11.25 h1.1
Drill Drawing:
  lines w0.1: -8.95,-12 -8.95,12.9 9.5,12.9 9.5,-12 -8.95,-12
  text "PRESS-FIT TECHNOLOGY" at -9.5,-7.65 h1
  text "diam. 0.6mm +0.06 -0" at 11,-7.65 h1
3D body "TYCO_6469048-1.stp": height 17.67, standoff -5.68, extent -8.95,-12 25.6,12.9

## TYCO_6469081-1 [mm] "60 Positions, Pitch 2.5mm,  Advanced TCA, Z-PACK HM-Zd BackPlane Press Fit Receptacle"
height 12.18
pads (90):
  round 1.1 hole 0.6: A1(6,11.25) A2(6,8.75) A3(6,6.25) A4(6,3.75) A5(6,1.25) A6(6,-1.25) A7(6,-3.75) A8(6,-6.25) A9(6,-8.75) A10(6,-11.25) B1(4.5,11.25) B2(4.5,8.75) B3(4.5,6.25) B4(4.5,3.75) B5(4.5,1.25) B6(4.5,-1.25) B7(4.5,-3.75) B8(4.5,-6.25) B9(4.5,-8.75) B10(4.5,-11.25) BG1(3,11.25) BG2(3,8.75) BG3(3,6.25) BG4(3,3.75) BG5(3,1.25) BG6(3,-1.25) BG7(3,-3.75) BG8(3,-6.25) BG9(3,-8.75) BG10(3,-11.25) C1(1.5,11.25) C2(1.5,8.75) C3(1.5,6.25) C4(1.5,3.75) C5(1.5,1.25) C6(1.5,-1.25) C7(1.5,-3.75) C8(1.5,-6.25) C9(1.5,-8.75) C10(1.5,-11.25) D1(0,11.25) D2(0,8.75) D3(0,6.25) D4(0,3.75) D5(0,1.25) D6(0,-1.25) D7(0,-3.75) D8(0,-6.25) D9(0,-8.75) D10(0,-11.25) DG1(-1.5,11.25) DG2(-1.5,8.75) DG3(-1.5,6.25) DG4(-1.5,3.75) DG5(-1.5,1.25) DG6(-1.5,-1.25) DG7(-1.5,-3.75) DG8(-1.5,-6.25) DG9(-1.5,-8.75) DG10(-1.5,-11.25) E1(-3,11.25) E2(-3,8.75) E3(-3,6.25) E4(-3,3.75) E5(-3,1.25) E6(-3,-1.25) E7(-3,-3.75) E8(-3,-6.25) E9(-3,-8.75) E10(-3,-11.25) F1(-4.5,11.25) F2(-4.5,8.75) F3(-4.5,6.25) F4(-4.5,3.75) F5(-4.5,1.25) F6(-4.5,-1.25) F7(-4.5,-3.75) F8(-4.5,-6.25) F9(-4.5,-8.75) F10(-4.5,-11.25) FG1(-6,11.25) FG2(-6,8.75) FG3(-6,6.25) FG4(-6,3.75) FG5(-6,1.25) FG6(-6,-1.25) FG7(-6,-3.75) FG8(-6,-6.25) FG9(-6,-8.75) FG10(-6,-11.25)
Top Overlay:
  lines w0.2: -6.7,-12.9 16.7,-12.9 16.7,12 6.498,12 ; -6.7,12 -6.497,12 ; -5.502,12 -4.997,12 ; -4.002,12 -3.497,12 ; -2.502,12 -1.997,12 ; -1.002,12 -0.497,12 ; 0.498,12 1.003,12 ; 1.998,12 2.503,12 ; 3.498,12 4.003,12 ; 4.998,12 5.503,12 ; 16.35,-12.9 16.35,-7.45 ; 16.35,-3.45 16.35,2.55 ; 16.35,6.55 16.35,12 ; 16.7,-9.95 17.7,-8.95 17.7,-6.95 17.45,-6.7 ; 16.7,9.05 17.7,8.05 17.7,6.05 17.45,5.8 ; 12.4,-7.352 12.4,-3.548 15.2,-3.45 16.7,-3.45 17.7,-4.45 17.7,-6.45 16.7,-7.45 15.2,-7.45 12.4,-7.352 ; 12.4,2.648 12.4,6.452 15.2,6.55 16.7,6.55 17.7,5.55 17.7,3.55 16.7,2.55 15.2,2.55 12.4,2.648
  text "A10" at 7.475,-11.8 h1.1
  text "A1" at 7.375,10.325 h1.1
Mechanical 8:
  drawing of 366 lines, arcs and shapes, not listed
  text "PCB Edge" at 8.865,-3.95 h1
Mechanical 14:
  lines w0.1: 16.35,-12.9 16.35,12 ; 16.7,-9.95 17.7,-8.95 17.7,-6.95 17.45,-6.7 ; 16.7,9.05 17.7,8.05 17.7,6.05 17.45,5.8 ; -6.7,-12.9 -6.7,12 16.7,12 16.7,-12.9 -6.7,-12.9 ; 12.4,-7.352 12.4,-3.548 15.2,-3.45 16.7,-3.45 17.7,-4.45 17.7,-6.45 16.7,-7.45 15.2,-7.45 12.4,-7.352 ; 12.4,2.648 12.4,6.452 15.2,6.55 16.7,6.55 17.7,5.55 17.7,3.55 16.7,2.55 15.2,2.55 12.4,2.648
  text "A10" at 7.475,-11.8 h1.1
  text "A1" at 7.375,10.325 h1.1
Drill Drawing:
  lines w0.1: -6.7,-12.9 -6.7,12 7.5,12 7.5,-12.9 -6.7,-12.9
  text "PRESS-FIT TECHNOLOGY" at -7.25,-8.55 h1
  text "diam. 0.6mm +0.06 -0" at 9,-9 h1
3D body "TYCO_6469081-1.stp": height 12.17, standoff -4.68, extent -6.7,-12.9 17.7,12

## TYCO_6469183-1 [mm] "60 Positions, Pitch 2.5mm,  Advanced TCA, Z-PACK HM-Zd BackPlane Press Fit Header"
height 13.31
pads (90):
  round 1.1 hole 0.6: A1(6,-11.25) A2(6,-8.75) A3(6,-6.25) A4(6,-3.75) A5(6,-1.25) A6(6,1.25) A7(6,3.75) A8(6,6.25) A9(6,8.75) A10(6,11.25) B1(4.5,-11.25) B2(4.5,-8.75) B3(4.5,-6.25) B4(4.5,-3.75) B5(4.5,-1.25) B6(4.5,1.25) B7(4.5,3.75) B8(4.5,6.25) B9(4.5,8.75) B10(4.5,11.25) BG1(3,-11.25) BG2(3,-8.75) BG3(3,-6.25) BG4(3,-3.75) BG5(3,-1.25) BG6(3,1.25) BG7(3,3.75) BG8(3,6.25) BG9(3,8.75) BG10(3,11.25) C1(1.5,-11.25) C2(1.5,-8.75) C3(1.5,-6.25) C4(1.5,-3.75) C5(1.5,-1.25) C6(1.5,1.25) C7(1.5,3.75) C8(1.5,6.25) C9(1.5,8.75) C10(1.5,11.25) D1(0,-11.25) D2(0,-8.75) D3(0,-6.25) D4(0,-3.75) D5(0,-1.25) D6(0,1.25) D7(0,3.75) D8(0,6.25) D9(0,8.75) D10(0,11.25) DG1(-1.5,-11.25) DG2(-1.5,-8.75) DG3(-1.5,-6.25) DG4(-1.5,-3.75) DG5(-1.5,-1.25) DG6(-1.5,1.25) DG7(-1.5,3.75) DG8(-1.5,6.25) DG9(-1.5,8.75) DG10(-1.5,11.25) E1(-3,-11.25) E2(-3,-8.75) E3(-3,-6.25) E4(-3,-3.75) E5(-3,-1.25) E6(-3,1.25) E7(-3,3.75) E8(-3,6.25) E9(-3,8.75) E10(-3,11.25) F1(-4.5,-11.25) F2(-4.5,-8.75) F3(-4.5,-6.25) F4(-4.5,-3.75) F5(-4.5,-1.25) F6(-4.5,1.25) F7(-4.5,3.75) F8(-4.5,6.25) F9(-4.5,8.75) F10(-4.5,11.25) FG1(-6,-11.25) FG2(-6,-8.75) FG3(-6,-6.25) FG4(-6,-3.75) FG5(-6,-1.25) FG6(-6,1.25) FG7(-6,3.75) FG8(-6,6.25) FG9(-6,8.75) FG10(-6,11.25)
Top Overlay:
  lines w0.2: -6.65,-11.873 -6.65,-12 -6.497,-12 ; -6.65,-10.628 -6.65,-9.373 ; -6.65,-8.128 -6.65,-6.872 ; -6.65,-5.628 -6.65,-4.372 ; -6.65,-3.128 -6.65,-1.872 ; -6.65,-0.628 -6.65,0.628 ; -6.65,1.872 -6.65,3.128 ; -6.65,4.372 -6.65,5.628 ; -6.65,6.872 -6.65,8.128 ; -6.65,9.373 -6.65,10.628 ; -6.65,11.873 -6.65,12.9 23.35,12.9 23.35,-12 6.498,-12 ; -5.502,-12 -4.997,-12 ; -4.002,-12 -3.497,-12 ; -2.502,-12 -1.997,-12 ; -1.002,-12 -0.497,-12 ; 0.498,-12 1.003,-12 ; 1.998,-12 2.503,-12 ; 3.498,-12 4.003,-12 ; 4.998,-12 5.503,-12
  text "A1" at 8.95,-11.25 h1.1
  text "A10" at 8.95,9.25 h1.1
Mechanical 8:
  drawing of 366 lines, arcs and shapes, not listed
  text "PCB Edge" at 8.865,-3.05 h1
Mechanical 14:
  lines w0.1: -6.65,-12 23.35,-12 23.35,12.9 -6.65,12.9 -6.65,-12
  text "A1" at 8.95,-11.25 h1.1
  text "A10" at 8.95,9.25 h1.1
Drill Drawing:
  lines w0.1: -6.65,-12 -6.65,12.9 7.55,12.9 7.55,-12 -6.65,-12
  text "PRESS-FIT TECHNOLOGY" at -7.2,-7.65 h1
  text "diam. 0.6mm +0.06 -0" at 9.05,-8.1 h1
3D body "TYCO_6469183-1.stp": height 13.31, standoff -5.68, extent -6.65,-12 23.35,12.9

## TYCO_EDA-03521-V1-0 [mm] "TYCO ELECTRONICS 1648206-1 Adapter Kit for PCB Mount, 29 Contacts Socket Housing Size : #12 + #20 + #12, ELCON Drawer Series Connectors"
height 27.2
pads (29):
  round 4.75 hole 2.7: 1(25.4,3.81) 2(25.4,-3.81) 3(17.78,3.81) 4(17.78,-3.81) 26(-17.78,3.81) 27(-17.78,-3.81) 28(-25.4,3.81) 29(-25.4,-3.81)
  round 2.55 hole 1.3: 5(11.43,3.81) 6(11.43,0) 7(11.43,-3.81) 8(7.62,3.81) 9(7.62,0) 10(7.62,-3.81) 11(3.81,3.81) 12(3.81,0) 13(3.81,-3.81) 14(0,3.81) 15(0,0) 16(0,-3.81) 17(-3.81,3.81) 18(-3.81,0) 19(-3.81,-3.81) 20(-7.62,3.81) 21(-7.62,0) 22(-7.62,-3.81) 23(-11.43,3.81) 24(-11.43,0) 25(-11.43,-3.81)
Top Overlay:
  circle w0.2: c-17.78,3.81 r3.226
  circle w0.2: c-17.78,-3.81 r3.226
  circle w0.2: c-25.4,3.81 r3.226
  circle w0.2: c-25.4,-3.81 r3.226
  circle w0.2: c17.78,3.81 r3.226
  circle w0.2: c17.78,-3.81 r3.226
  circle w0.2: c25.4,3.81 r3.226
  circle w0.2: c25.4,-3.81 r3.226
  lines w0.2: -41.402,-7.112 -37.592,-10.922 12.319,-10.922 cw(c12.319,-12.7) 14.097,-12.7 ccw(c18.415,-12.7) 18.415,-17.018 30.607,-17.018 ccw(c30.607,-12.7) 34.925,-12.7 cw(c36.703,-12.7) 36.703,-10.922 37.592,-10.922 41.402,-7.112 41.402,-5.08 38.1,-5.08 cw(c38.1,0) 38.1,5.08 41.402,5.08 41.402,7.112 37.592,10.922 -12.319,10.922 cw(c-12.319,12.7) -14.097,12.7 ccw(c-18.415,12.7) -18.415,17.018 -30.607,17.018 ccw(c-30.607,12.7) -34.925,12.7 cw(c-36.703,12.7) -36.703,10.922 -37.592,10.922 -41.402,7.112 -41.402,5.08 -38.1,5.08 cw(c-38.1,0) -38.1,-5.08 -41.402,-5.08 -41.402,-7.112 ; -28.321,10.414 cw(c-28.321,12.7) -28.321,14.986 -20.701,14.986 cw(c-20.701,12.7) -20.701,10.414 -21.412,10.414 -21.412,11.196 -22.873,12.04 -24.333,11.196 -24.333,10.414 -28.321,10.414 ; -28.321,12.446 cw(c-28.321,12.7) -28.321,12.954 -20.701,12.954 cw(c-20.701,12.7) -20.701,12.446 -28.321,12.446 ; -13.462,-5.08 -12.192,-6.35 12.192,-6.35 13.462,-5.08 13.462,6.35 -13.462,6.35 -13.462,-5.08 ; 20.701,-14.986 cw(c20.701,-12.7) 20.701,-10.414 24.841,-10.414 24.841,-11.196 26.302,-12.04 27.762,-11.196 27.762,-10.414 28.321,-10.414 cw(c28.321,-12.7) 28.321,-14.986 20.701,-14.986 ; 20.701,-12.954 cw(c20.701,-12.7) 20.701,-12.446 28.321,-12.446 cw(c28.321,-12.7) 28.321,-12.954 20.701,-12.954
  text "23" at -12.3,7 h1.2
  text "25" at -12.46,-8.2 h1.2
  text "7" at 10.9,-8.2 h1.2
  text "5" at 11.2,6.9 h1.2
  text "28" at -30.403,0.2 h1.2
  text "29" at -30.403,-7.42 h1.2
  text "2" at 28.35,-7.42 h1.2
  text "1" at 28.5,0.2 h1.2
Mechanical 8:
  lines w0.05: -25.9,-3.81 -25.4,-3.81 ; -25.9,3.81 -25.4,3.81 ; -25.4,-4.31 -25.4,-3.81 ; -25.4,-3.31 -25.4,-3.81 ; -25.4,3.31 -25.4,3.81 ; -25.4,4.31 -25.4,3.81 ; -24.9,-3.81 -25.4,-3.81 ; -24.9,3.81 -25.4,3.81 ; -18.28,-3.81 -17.78,-3.81 ; -18.28,3.81 -17.78,3.81 ; -17.78,-4.31 -17.78,-3.81 ; -17.78,-3.31 -17.78,-3.81 ; -17.78,3.31 -17.78,3.81 ; -17.78,4.31 -17.78,3.81 ; -17.28,-3.81 -17.78,-3.81 ; -17.28,3.81 -17.78,3.81 ; -11.93,-3.81 -11.43,-3.81 ; -11.93,0 -11.43,0 ; -11.93,3.81 -11.43,3.81 ; -11.43,-4.31 -11.43,-3.81 ; -11.43,-3.31 -11.43,-3.81 ; -11.43,-0.5 -11.43,0 ; -11.43,0.5 -11.43,0 ; -11.43,3.31 -11.43,3.81 ; -11.43,4.31 -11.43,3.81 ; -10.93,-3.81 -11.43,-3.81 ; -10.93,0 -11.43,0 ; -10.93,3.81 -11.43,3.81 ; -8.12,-3.81 -7.62,-3.81 ; -8.12,0 -7.62,0 ; -8.12,3.81 -7.62,3.81 ; -7.62,-4.31 -7.62,-3.81 ; -7.62,-3.31 -7.62,-3.81 ; -7.62,-0.5 -7.62,0 ; -7.62,0.5 -7.62,0 ; -7.62,3.31 -7.62,3.81 ; -7.62,4.31 -7.62,3.81 ; -7.12,-3.81 -7.62,-3.81 ; -7.12,0 -7.62,0 ; -7.12,3.81 -7.62,3.81 ; -4.31,-3.81 -3.81,-3.81 ; -4.31,0 -3.81,0 ; -4.31,3.81 -3.81,3.81 ; -3.81,-4.31 -3.81,-3.81 ; -3.81,-3.31 -3.81,-3.81 ; -3.81,-0.5 -3.81,0 ; -3.81,0.5 -3.81,0 ; -3.81,3.31 -3.81,3.81 ; -3.81,4.31 -3.81,3.81 ; -3.31,-3.81 -3.81,-3.81 ; -3.31,0 -3.81,0 ; -3.31,3.81 -3.81,3.81 ; -0.5,-3.81 0,-3.81 ; -0.5,0 0,0 ; -0.5,3.81 0,3.81 ; 0,-4.31 0,-3.81 ; 0,-3.31 0,-3.81 ; 0,-0.5 0,0 ; 0,0.5 0,0 ; 0,3.31 0,3.81 ; 0,4.31 0,3.81 ; 0.5,-3.81 0,-3.81 ; 0.5,0 0,0 ; 0.5,3.81 0,3.81 ; 3.31,-3.81 3.81,-3.81 ; 3.31,0 3.81,0 ; 3.31,3.81 3.81,3.81 ; 3.81,-4.31 3.81,-3.81 ; 3.81,-3.31 3.81,-3.81 ; 3.81,-0.5 3.81,0 ; 3.81,0.5 3.81,0 ; 3.81,3.31 3.81,3.81 ; 3.81,4.31 3.81,3.81 ; 4.31,-3.81 3.81,-3.81 ; 4.31,0 3.81,0 ; 4.31,3.81 3.81,3.81 ; 7.12,-3.81 7.62,-3.81 ; 7.12,0 7.62,0 ; 7.12,3.81 7.62,3.81 ; 7.62,-4.31 7.62,-3.81 ; 7.62,-3.31 7.62,-3.81 ; 7.62,-0.5 7.62,0 ; 7.62,0.5 7.62,0 ; 7.62,3.31 7.62,3.81 ; 7.62,4.31 7.62,3.81 ; 8.12,-3.81 7.62,-3.81 ; 8.12,0 7.62,0 ; 8.12,3.81 7.62,3.81 ; 10.93,-3.81 11.43,-3.81 ; 10.93,0 11.43,0 ; 10.93,3.81 11.43,3.81 ; 11.43,-4.31 11.43,-3.81 ; 11.43,-3.31 11.43,-3.81 ; 11.43,-0.5 11.43,0 ; 11.43,0.5 11.43,0 ; 11.43,3.31 11.43,3.81 ; 11.43,4.31 11.43,3.81 ; 11.93,-3.81 11.43,-3.81 ; 11.93,0 11.43,0 ; 11.93,3.81 11.43,3.81 ; 17.28,-3.81 17.78,-3.81 ; 17.28,3.81 17.78,3.81 ; 17.78,-4.31 17.78,-3.81 ; 17.78,-3.31 17.78,-3.81 ; 17.78,3.31 17.78,3.81 ; 17.78,4.31 17.78,3.81 ; 18.28,-3.81 17.78,-3.81 ; 18.28,3.81 17.78,3.81 ; 24.9,-3.81 25.4,-3.81 ; 24.9,3.81 25.4,3.81 ; 25.4,-4.31 25.4,-3.81 ; 25.4,-3.31 25.4,-3.81 ; 25.4,3.31 25.4,3.81 ; 25.4,4.31 25.4,3.81 ; 25.9,-3.81 25.4,-3.81 ; 25.9,3.81 25.4,3.81
Mechanical 14:
  circle w0.1: c-17.78,3.81 r1.397
  circle w0.1: c-17.78,3.81 r2.164
  circle w0.1: c-17.78,-3.81 r1.397
  circle w0.1: c-17.78,-3.81 r2.164
  circle w0.1: c-25.4,3.81 r1.397
  circle w0.1: c-25.4,3.81 r2.164
  circle w0.1: c-25.4,-3.81 r1.397
  circle w0.1: c-25.4,-3.81 r2.164
  circle w0.1: c17.78,3.81 r1.397
  circle w0.1: c17.78,3.81 r2.159
  circle w0.1: c17.78,-3.81 r1.397
  circle w0.1: c17.78,-3.81 r2.159
  circle w0.1: c25.4,3.81 r1.397
  circle w0.1: c25.4,3.81 r2.159
  circle w0.1: c25.4,-3.81 r1.397
  circle w0.1: c25.4,-3.81 r2.159
  circle w0.1: c-11.43,3.81 r1.448
  circle w0.1: c-11.43,0 r1.448
  circle w0.1: c-11.43,-3.81 r1.448
  circle w0.1: c-7.62,3.81 r1.448
  circle w0.1: c-7.62,0 r1.448
  circle w0.1: c-7.62,-3.81 r1.448
  circle w0.1: c-3.81,3.81 r1.448
  circle w0.1: c-3.81,0 r1.448
  circle w0.1: c-3.81,-3.81 r1.448
  circle w0.1: c0,3.81 r1.448
  circle w0.1: c0,0 r1.448
  circle w0.1: c0,-3.81 r1.448
  circle w0.1: c3.81,3.81 r1.448
  circle w0.1: c3.81,0 r1.448
  circle w0.1: c3.81,-3.81 r1.448
  circle w0.1: c7.62,3.81 r1.448
  circle w0.1: c7.62,0 r1.448
  circle w0.1: c7.62,-3.81 r1.448
  circle w0.1: c11.43,3.81 r1.448
  circle w0.1: c11.43,0 r1.448
  circle w0.1: c11.43,-3.81 r1.448
  circle w0.1: c-17.78,3.81 r3.226
  circle w0.1: c-17.78,-3.81 r3.226
  circle w0.1: c-25.4,3.81 r3.226
  circle w0.1: c-25.4,-3.81 r3.226
  circle w0.1: c17.78,3.81 r3.226
  circle w0.1: c17.78,-3.81 r3.226
  circle w0.1: c25.4,3.81 r3.226
  circle w0.1: c25.4,-3.81 r3.226
  circle w0.1: c-11.43,3.81 r0.686
  circle w0.1: c-7.62,3.81 r0.686
  circle w0.1: c-7.62,0 r0.686
  circle w0.1: c-3.81,-3.81 r0.686
  circle w0.1: c-3.81,3.81 r0.686
  circle w0.1: c0,0 r0.686
  circle w0.1: c3.81,-3.81 r0.686
  circle w0.1: c3.81,3.81 r0.686
  circle w0.1: c7.62,0 r0.686
  circle w0.1: c11.43,-3.81 r0.686
  circle w0.1: c11.43,3.81 r0.686
  circle w0.1: c11.43,0 r0.686
  circle w0.1: c7.62,-3.81 r0.686
  circle w0.1: c7.62,3.81 r0.686
  circle w0.1: c3.81,0 r0.686
  circle w0.1: c0,-3.81 r0.686
  circle w0.1: c0,3.81 r0.686
  circle w0.1: c-3.81,0 r0.686
  circle w0.1: c-7.62,-3.81 r0.686
  circle w0.1: c-11.43,-3.81 r0.686
  circle w0.1: c-11.43,0 r0.686
  lines w0.1: -41.402,-7.112 -37.592,-10.922 12.319,-10.922 cw(c12.319,-12.7) 14.097,-12.7 ccw(c18.415,-12.7) 18.415,-17.018 30.607,-17.018 ccw(c30.607,-12.7) 34.925,-12.7 cw(c36.703,-12.7) 36.703,-10.922 37.592,-10.922 41.402,-7.112 41.402,-5.08 38.1,-5.08 cw(c38.1,0) 38.1,5.08 41.402,5.08 41.402,7.112 37.592,10.922 -12.319,10.922 cw(c-12.319,12.7) -14.097,12.7 ccw(c-18.415,12.7) -18.415,17.018 -30.607,17.018 ccw(c-30.607,12.7) -34.925,12.7 cw(c-36.703,12.7) -36.703,10.922 -37.592,10.922 -41.402,7.112 -41.402,5.08 -38.1,5.08 cw(c-38.1,0) -38.1,-5.08 -41.402,-5.08 -41.402,-7.112 ; -28.321,10.414 cw(c-28.321,12.7) -28.321,14.986 -20.701,14.986 cw(c-20.701,12.7) -20.701,10.414 -21.412,10.414 -21.412,11.196 -22.873,12.04 -24.333,11.196 -24.333,10.414 -28.321,10.414 ; -28.321,12.446 cw(c-28.321,12.7) -28.321,12.954 -20.701,12.954 cw(c-20.701,12.7) -20.701,12.446 -28.321,12.446 ; -13.462,-5.08 -12.192,-6.35 12.192,-6.35 13.462,-5.08 13.462,6.35 -13.462,6.35 -13.462,-5.08 ; 20.701,-14.986 cw(c20.701,-12.7) 20.701,-10.414 24.841,-10.414 24.841,-11.196 26.302,-12.04 27.762,-11.196 27.762,-10.414 28.321,-10.414 cw(c28.321,-12.7) 28.321,-14.986 20.701,-14.986 ; 20.701,-12.954 cw(c20.701,-12.7) 20.701,-12.446 28.321,-12.446 cw(c28.321,-12.7) 28.321,-12.954 20.701,-12.954
  text "23" at -12.3,7 h1.2
  text "25" at -12.46,-8.2 h1.2
  text "7" at 10.9,-8.2 h1.2
  text "5" at 11.2,6.9 h1.2
  text "1" at 28.5,0.2 h1.2
  text "2" at 28.35,-7.42 h1.2
  text "29" at -30.403,-7.42 h1.2
  text "28" at -30.403,0.2 h1.2
3D body "TYCO_EDA-03521-V1-0.stp": height 27.68, standoff -6.02, extent -41.402,-17.018 41.402,17.018